# Altium footprint library THD Packages.PcbLib: 161 footprints (part 11 of 11)
Each footprint in its own frame and in the unit in brackets; x right, y up, seen from the top. Pads: shape width x height; smd on the part's side, far side on the other; paste and mask are expansions set on the pad; w line width, h text height; cw(c..) or ccw(c..) is an arc to the next point about the centre after c.
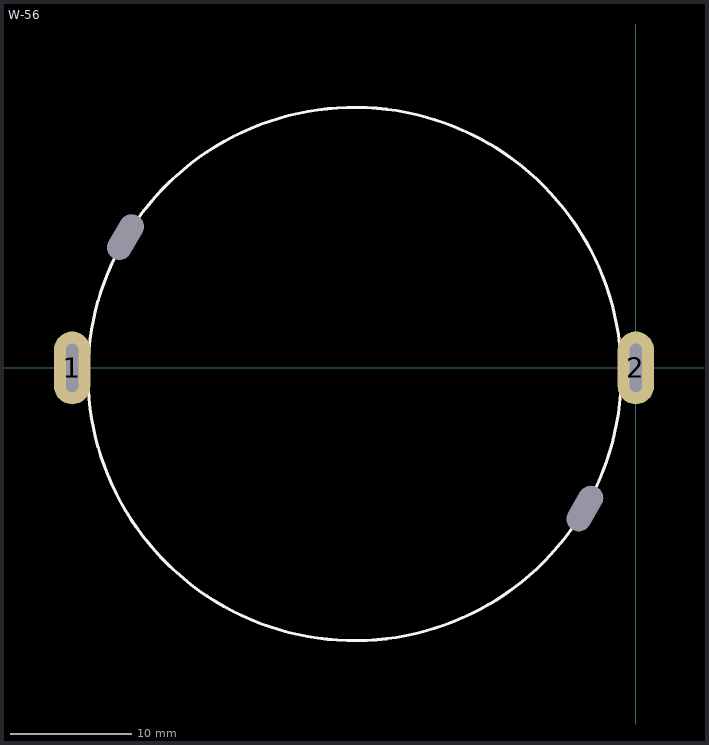
[diagram p10: the footprint, top view; thin cyan lines are the x and y axes]

## W-56 [mm]
pads (4):
  round 0 hole 2 slot 4 at 60 deg: 0(-42.1,10.8) 0(-4.2,-11.6)
  oval 3x6 hole 1 slot 4 at 90 deg: 1(-46.5,0) 2(0,0)
Top Overlay:
  circle w0.254: c-23.2,-0.5 r22
3D body: height 13.2, standoff 0, extent -45.45,-22.706 -1.126,21.706